# Altium footprint library passives_ITS_v1.PcbLib: 43 footprints (part 1 of 3)
Each footprint in its own frame and in the unit in brackets; x right, y up, seen from the top. Pads: shape width x height; smd on the part's side, far side on the other; paste and mask are expansions set on the pad; w line width, h text height; cw(c..) or ccw(c..) is an arc to the next point about the centre after c.
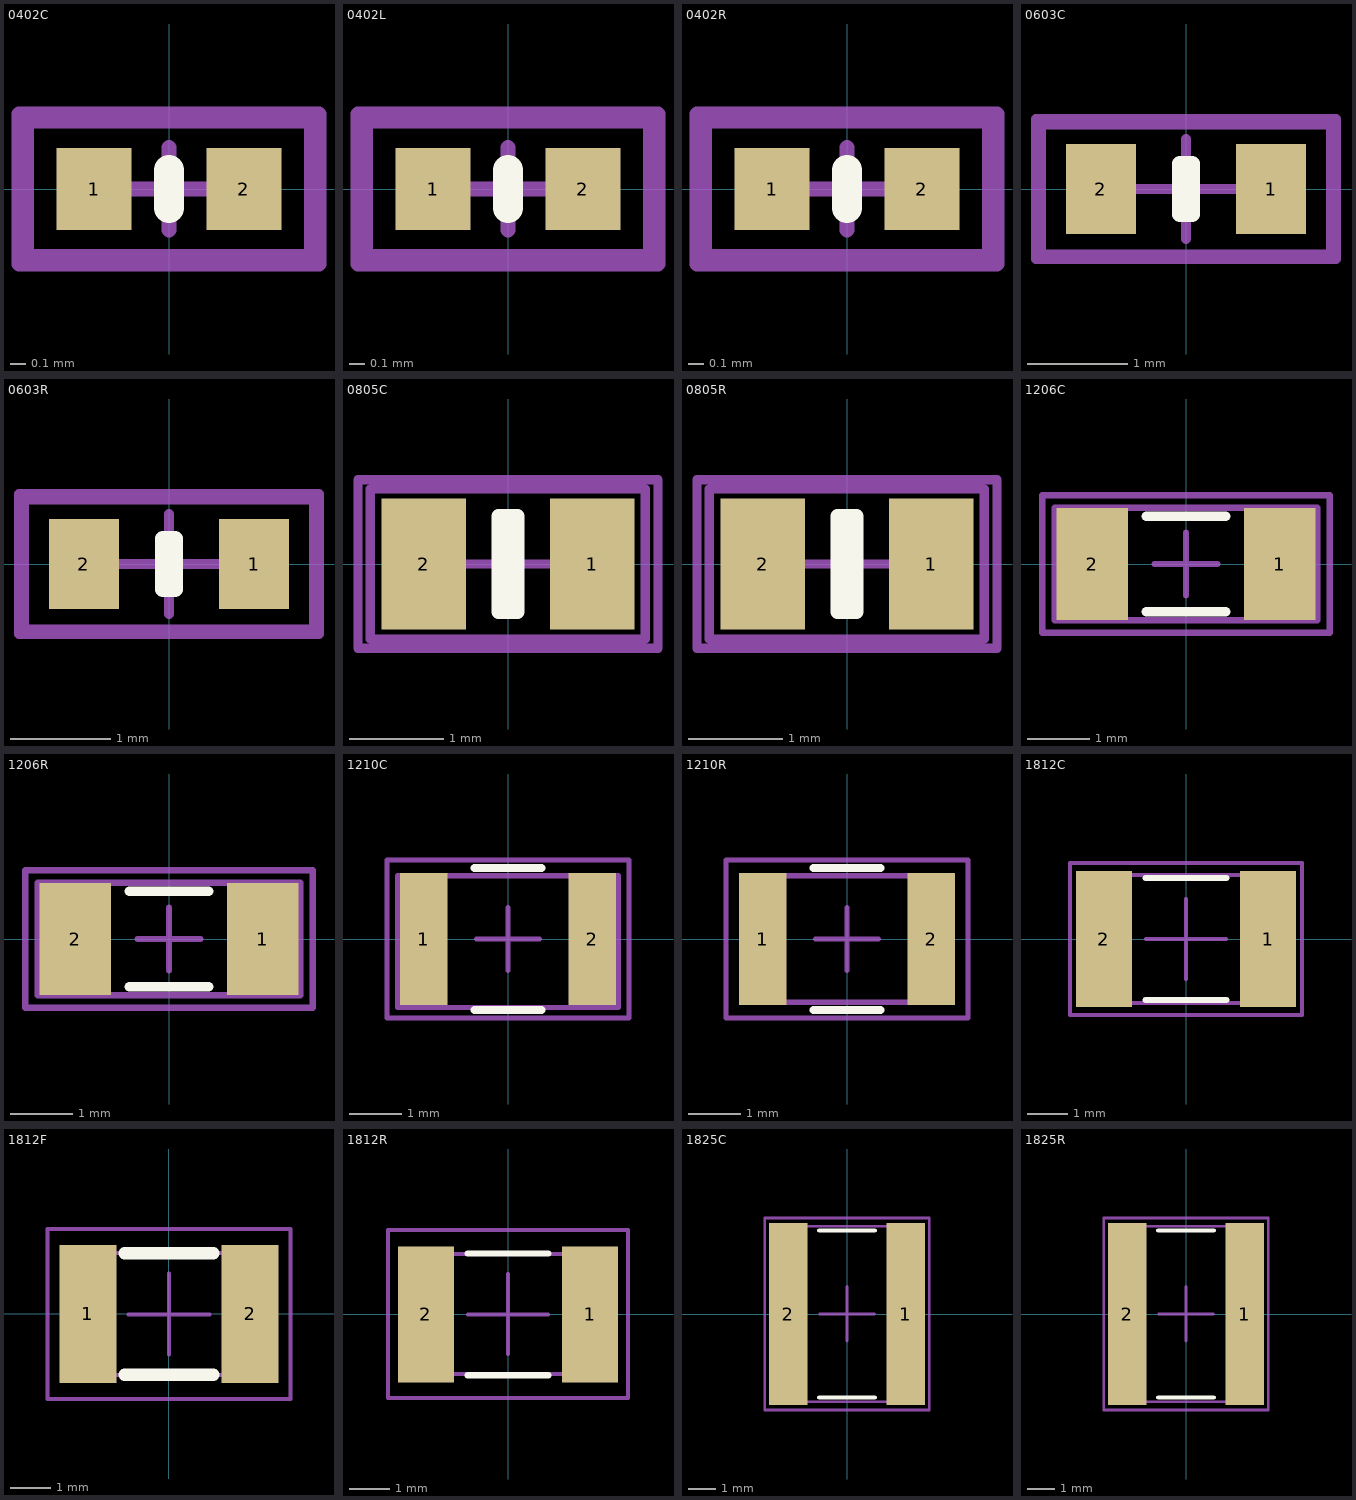
[diagram p0: the footprints below, top view; thin cyan lines are the x and y axes]

## 0402C [mm]
height 0.37
pads (2):
  rect 0.5x0.55 smd: 1(-0.5,0) 2(0.5,0)
Top Overlay:
  lines w0.2: 0,-0.125 0,0.125
Top M11-12_SMOT:
  lines w0.1: -0.949,-0.452 0.95,-0.452 0.95,0.453 -0.949,0.453 -0.949,-0.452
Top M13-14_SDES:
  text "'.Designator'" at -2.266,-0.167 h0.4
M15_Orgin:
  lines w0.1: -0.275,0 0.275,0 ; 0,-0.275 0,0.275 ; -1,-0.5 1,-0.5 1,0.5 -1,0.5 -1,-0.5
3D body "0402(1005M)_C.step": height 0.52, standoff 0.01, extent -0.514,-0.254 0.502,0.254

## 0402L [mm]
height 0.37
pads (2):
  rect 0.5x0.55 smd: 1(-0.5,0) 2(0.5,0)
Top Overlay:
  lines w0.2: 0,-0.125 0,0.125
Top M11-12_SMOT:
  lines w0.1: -0.949,-0.452 0.95,-0.452 0.95,0.453 -0.949,0.453 -0.949,-0.452
Top M13-14_SDES:
  text "'.Designator'" at -2.266,-0.167 h0.4
M15_Orgin:
  lines w0.1: -0.275,0 0.275,0 ; 0,-0.275 0,0.275 ; -1,-0.5 -1,0.5 1,0.5 1,-0.5 -1,-0.5
3D body "0402(1005M)R.step": height 0.52, standoff 0.01, extent -0.514,-0.254 0.502,0.254

## 0402R [mm]
height 0.37
pads (2):
  rect 0.5x0.55 smd: 1(-0.5,0) 2(0.5,0)
Top Overlay:
  lines w0.2: 0,-0.125 0,0.125
Top M11-12_SMOT:
  lines w0.1: -0.949,-0.452 -0.949,0.453 0.95,0.453 0.95,-0.452 -0.949,-0.452
Top M13-14_SDES:
  text "'.Designator'" at -2.266,-0.167 h0.4
M15_Orgin:
  lines w0.1: -0.275,0 0.275,0 ; 0,-0.275 0,0.275 ; -1,-0.5 -1,0.5 1,0.5 1,-0.5 -1,-0.5
3D body "0402(1005M)R.step": height 0.52, standoff 0.01, extent -0.514,-0.254 0.502,0.254

## 0603C [mm]
height 0.381
pads (2):
  rect 0.7x0.9 smd: 1(0.85,0) 2(-0.85,0)
Top Overlay:
  lines w0.152: -0.064,-0.254 0.064,-0.254 0.064,0.254 -0.064,0.254 -0.064,-0.254
Top M11-12_SMOT:
  lines w0.1: -1.45,-0.654 1.45,-0.654 1.45,0.647 -1.45,0.647 -1.45,-0.654
Top M13-14_SDES:
  text "'.Designator'" at -3.399,-0.25 h0.6
M15_Orgin:
  lines w0.1: -0.5,0 0.5,0 ; 0,-0.5 0,0.5 ; -1.5,-0.7 -1.5,0.7 1.5,0.7 1.5,-0.7 -1.5,-0.7
3D body "0603(1608M) Cap.step": height 0.79, standoff 0, extent -1,-0.394 1,0.394

## 0603R [mm]
height 0.381
pads (2):
  rect 0.7x0.9 smd: 1(0.85,0) 2(-0.85,0)
Top Overlay:
  lines w0.152: -0.064,-0.254 0.064,-0.254 0.064,0.254 -0.064,0.254 -0.064,-0.254
Top M11-12_SMOT:
  lines w0.1: -1.45,-0.654 -1.45,0.647 1.45,0.647 1.45,-0.654 -1.45,-0.654
Top M13-14_SDES:
  text "'.Designator'" at -3.399,-0.25 h0.6
M15_Orgin:
  lines w0.1: -0.5,0 0.5,0 ; 0,-0.5 0,0.5 ; -1.5,-0.7 -1.5,0.7 1.5,0.7 1.5,-0.7 -1.5,-0.7
3D body "User Library-0603(1608M) Res.step": height 0.8, standoff 0.01, extent -1,-0.394 1,0.394

## 0805C [mm]
pads (2):
  rect 0.9x1.4 smd: 1(0.9,0) 2(-0.9,0)
Top Overlay:
  rectangle: -0.127,-0.508 0.127,0.508
  lines w0.152: -0.102,-0.508 -0.102,0.508 0.102,0.508 0.102,-0.508 -0.102,-0.508
Top M11-12_SMOT:
  lines w0.1: -1.468,-0.8 1.465,-0.8 1.465,0.8 -1.468,0.8 -1.468,-0.8
Top M13-14_SDES:
  text "'.Designator'" at -3.518,-0.582 h0.6
M15_Orgin:
  lines w0.1: -0.5,0 0.5,0 ; 0,-0.5 0,0.5 ; -1.6,-0.9 -1.6,0.9 1.6,0.9 1.6,-0.9 -1.6,-0.9
3D body "SMD_0805_Capacitor.step": height 0.79, standoff 0.01, extent -1,-0.625 1,0.625

## 0805R [mm]
pads (2):
  rect 0.9x1.4 smd: 1(0.9,0) 2(-0.9,0)
Top Overlay:
  rectangle: -0.127,-0.508 0.127,0.508
  lines w0.152: -0.102,-0.508 -0.102,0.508 0.102,0.508 0.102,-0.508 -0.102,-0.508
Top M11-12_SMOT:
  lines w0.1: -1.468,-0.8 1.465,-0.8 1.465,0.8 -1.468,0.8 -1.468,-0.8
Top M13-14_SDES:
  text "'.Designator'" at -3.518,-0.582 h0.6
M15_Orgin:
  lines w0.1: -0.5,0 0.5,0 ; 0,-0.5 0,0.5 ; -1.6,-0.9 -1.6,0.9 1.6,0.9 1.6,-0.9 -1.6,-0.9
3D body "User Library-0805(2012M) Res.step": height 0.8, standoff 0.01, extent -1.254,-0.622 1.254,0.622

## 1206C [mm]
pads (2):
  rect 1.15x1.8 smd: 1(1.5,0) 2(-1.5,0)
Top Overlay:
  lines w0.152: -0.635,-0.762 0.635,-0.762 ; -0.635,0.762 0.635,0.762
Top M11-12_SMOT:
  lines w0.1: -2.1,-0.9 -2.1,0.9 2.1,0.9 2.1,-0.9 -2.1,-0.9
Top M13-14_SDES:
  text "'.Designator'" at -3.518,-0.582 h0.6
M15_Orgin:
  lines w0.1: -0.5,0 0.5,0 ; 0,-0.5 0,0.5 ; -2.3,-1.1 -2.3,1.1 2.3,1.1 2.3,-1.1 -2.3,-1.1
3D body "SMD_1206_Capacitor.step": height 0.98, standoff -0.03, extent -1.6,-0.8 1.6,0.8

## 1206R [mm]
pads (2):
  rect 1.15x1.8 smd: 1(1.5,0) 2(-1.5,0)
Top Overlay:
  lines w0.152: -0.635,-0.762 0.635,-0.762 ; -0.635,0.762 0.635,0.762
Top M11-12_SMOT:
  lines w0.1: -2.1,-0.9 -2.1,0.9 2.1,0.9 2.1,-0.9 -2.1,-0.9
Top M13-14_SDES:
  text "'.Designator'" at -3.518,-0.582 h0.6
M15_Orgin:
  lines w0.1: -0.5,0 0.5,0 ; 0,-0.5 0,0.5 ; -2.3,-1.1 -2.3,1.1 2.3,1.1 2.3,-1.1 -2.3,-1.1
3D body "SMD_1206_Resistor.step": height 0.98, standoff -0.03, extent -1.524,-0.813 1.676,0.787

## 1210C [mm]
pads (2):
  rect 0.9x2.5 smd: 1(-1.6,0) 2(1.6,0)
Top Overlay:
  lines w0.152: -0.635,-1.346 0.635,-1.346 ; -0.635,1.346 0.635,1.346
Top M11-12_SMOT:
  lines w0.1: -2.1,-1.3 -2.1,1.2 2.1,1.2 2.1,-1.3 -2.1,-1.3
Top M13-14_SDES:
  text "'.Designator'" at -3.568,-0.55 h0.6
M15_Orgin:
  lines w0.1: -0.6,0 0,0 ; 0,-0.6 0,0 ; 0,0.6 0,0 ; 0.6,0 0,0 ; -2.3,-1.5 -2.3,1.5 2.3,1.5 2.3,-1.5 -2.3,-1.5
3D body "1210C.step": height 1.3, standoff 0, extent -1.651,-1.27 1.549,1.23

## 1210R [mm]
pads (2):
  rect 0.9x2.5 smd: 1(-1.6,0) 2(1.6,0)
Top Overlay:
  lines w0.152: -0.635,-1.346 0.635,-1.346 ; -0.635,1.346 0.635,1.346
Top M11-12_SMOT:
  lines w0.1: -1.9,-1.2 1.9,-1.2 1.9,1.2 -1.9,1.2 -1.9,-1.2
Top M13-14_SDES:
  text "'.Designator'" at -3.568,-0.55 h0.6
M15_Orgin:
  lines w0.1: -0.6,0 0,0 ; 0,-0.6 0,0 ; 0,0.6 0,0 ; 0.6,0 0,0 ; -2.3,-1.5 2.3,-1.5 2.3,1.5 -2.3,1.5 -2.3,-1.5
3D body "SMD_1210_Resistor.STEP": height 0.63, standoff 0, extent -2.1,-1.346 2.1,1.354

## 1812C [mm]
pads (2):
  rect 1.4x3.4 smd: 1(2.05,0) 2(-2.05,0)
Top Overlay:
  lines w0.152: -1.016,-1.524 1.016,-1.524 ; -1.016,1.524 1.016,1.524
Top M11-12_SMOT:
  lines w0.1: -2.6,-1.6 2.6,-1.6 2.6,1.6 -2.6,1.6 -2.6,-1.6
Top M13-14_SDES:
  text "'.Designator'" at -3.568,-0.55 h0.6
M15_Orgin:
  lines w0.1: -1,0 0,0 ; 0,-1 0,0 ; 0,1 0,0 ; 1,0 0,0 ; -2.9,-1.9 2.9,-1.9 2.9,1.9 -2.9,1.9 -2.9,-1.9
3D body "1812C.step": height 1.6, standoff 0, extent -2.21,-1.6 2.29,1.6

## 1812F [mm]
pads (2):
  rect 1.4x3.4 smd: 1(-2,0) 2(2,0)
Top Overlay:
  lines w0.3: -1.1,-1.5 1.1,-1.5 ; -1.1,1.5 1.1,1.5
Top M11-12_SMOT:
  lines w0.1: -2.25,-1.5 -2.25,1.5 2.25,1.5 2.25,-1.5 -2.25,-1.5
Top M13-14_SDES:
  text "'.Designator'" at -5.865,-0.95 h1
M15_Orgin:
  lines w0.1: -0.997,-0.008 0.003,-0.008 ; -0.003,-0.997 -0.003,0.003 ; -0.003,-0.008 0.997,-0.008 ; 0,0 0,1 ; -3,-2.1 -3,2.1 3,2.1 3,-2.1 -3,-2.1
3D body "0ZCG-0_70mm.step": height 0.91, standoff 0.01, extent -2.25,-1.6 2.25,1.6

## 1812R [mm]
pads (2):
  rect 1.4x3.4 smd: 1(2.05,0) 2(-2.05,0)
Top Overlay:
  lines w0.152: -1.016,-1.524 1.016,-1.524 ; -1.016,1.524 1.016,1.524
Top M11-12_SMOT:
  lines w0.1: -2.247,-1.492 2.253,-1.492 2.253,1.508 -2.247,1.508 -2.247,-1.492
Top M13-14_SDES:
  text "'.Designator'" at -5.862,-0.942 h1
M15_Orgin:
  lines w0.1: -0.995,0 0.005,0 ; 0,-0.989 0,0.011 ; 0,0 1,0 ; 0.003,0.008 0.003,1.008 ; -2.997,-2.092 3.003,-2.092 3.003,2.108 -2.997,2.108 -2.997,-2.092
3D body "1812R.step": height 1.6, standoff 0, extent -2.286,-1.6 2.214,1.6

## 1825C [mm]
pads (2):
  rect 1.4x6.65 smd: 1(2.15,0) 2(-2.15,0)
Top Overlay:
  lines w0.152: -1.016,-3.048 1.016,-3.048 ; -1.016,3.048 1.016,3.048
Top M11-12_SMOT:
  rectangle: -2.6,-3.2 -2.2,3.2
  region: 2.6,3.2 2.2,3.2 2.2,-3.2 2.6,-3.2
  lines w0.1: -2.6,-3.2 2.6,-3.2 2.6,3.2 -2.6,3.2 -2.6,-3.2
Top M13-14_SDES:
  text "'.Designator'" at 7.764,-10.78 h1
M15_Orgin:
  lines w0.1: -0.995,0 0.005,0 ; 0,-0.989 0,0.011 ; 0,0 1,0 ; 0.003,0.008 0.003,1.008 ; -2.997,-3.5 3.003,-3.5 3.003,3.5 -2.997,3.5 -2.997,-3.5
3D body "1825C.step": height 2.54, standoff 0, extent -2.794,-3.175 2.826,3.226

## 1825R [mm]
pads (2):
  rect 1.4x6.65 smd: 1(2.15,0) 2(-2.15,0)
Top Overlay:
  lines w0.152: -1.016,-3.048 1.016,-3.048 ; -1.016,3.048 1.016,3.048
Top M11-12_SMOT:
  rectangle: -2.6,-3.2 -2.2,3.2
  region: 2.6,3.2 2.2,3.2 2.2,-3.2 2.6,-3.2
  lines w0.1: -2.6,-3.2 2.6,-3.2 2.6,3.2 -2.6,3.2 -2.6,-3.2
Top M13-14_SDES:
  text "'.Designator'" at 7.764,-10.78 h1
M15_Orgin:
  lines w0.1: -0.995,0 0.005,0 ; 0,-0.989 0,0.011 ; 0,0 1,0 ; 0.003,0.008 0.003,1.008 ; -2.997,-3.5 3.003,-3.5 3.003,3.5 -2.997,3.5 -2.997,-3.5
3D body "1825R.step": height 2.54, standoff 0, extent -2.794,-3.175 2.826,3.226